# Altium footprint library Basal.PcbLib: 248 footprints (part 16 of 16)
Each footprint in its own frame and in the unit in brackets; x right, y up, seen from the top. Pads: shape width x height; smd on the part's side, far side on the other; paste and mask are expansions set on the pad; w line width, h text height; cw(c..) or ccw(c..) is an arc to the next point about the centre after c.
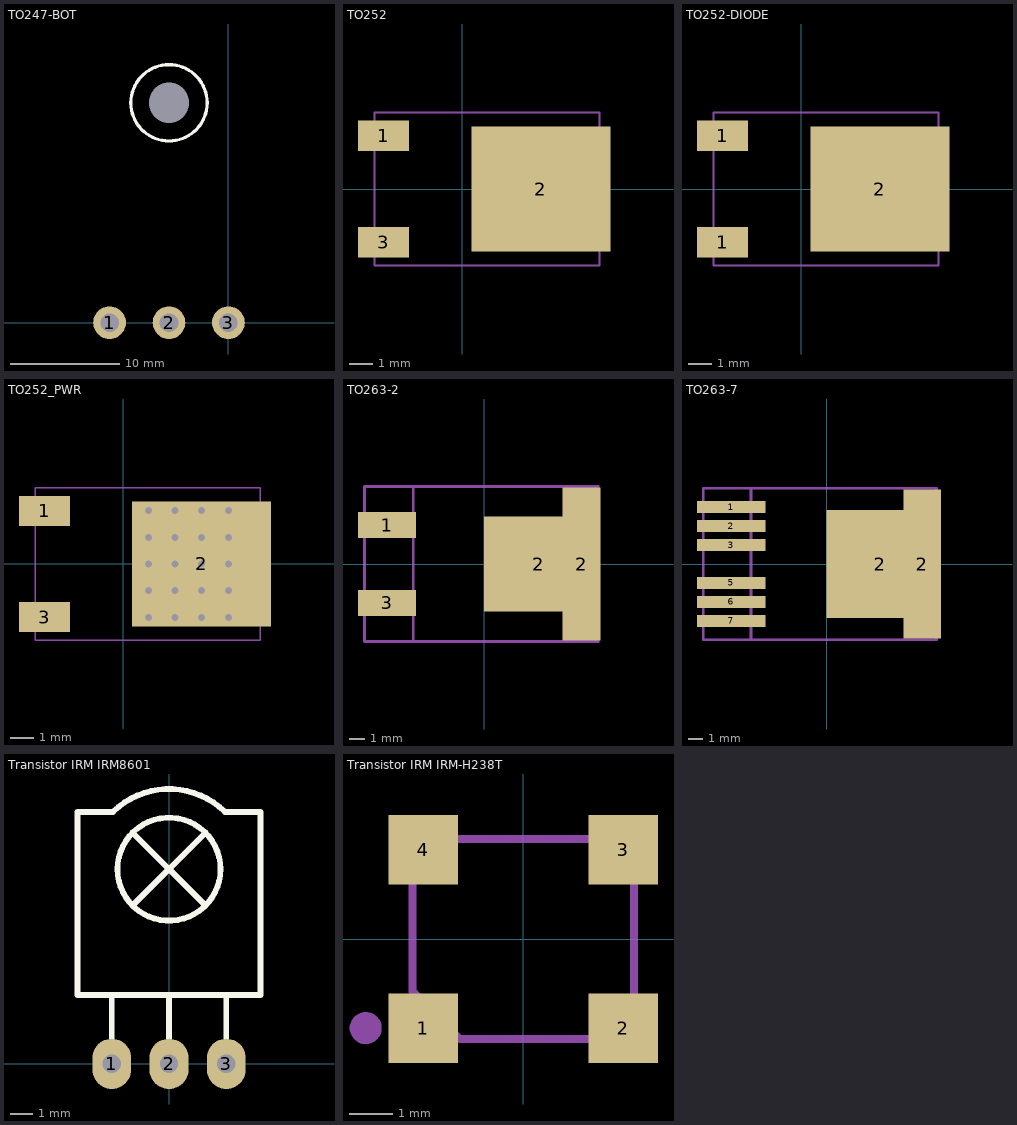
[diagram p15: the footprints below, top view; thin cyan lines are the x and y axes]

## TO247-BOT [mm]
pads (4):
  round 0 hole 3.7: 0(-5.45,20.15)
  round 3 hole 1.7: 1(-10.9,0) 2(-5.45,0) 3(0,0)
Top Overlay:
  circle w0.3: c-5.45,20.15 r3.5
Bottom Overlay:
  lines w0.254: -11.95,5.3 -11.95,1.3 -9.85,1.3 -9.85,5.3 ; -6.95,5.3 -6.95,1.3 -3.95,1.3 -3.95,5.3 ; -1.05,5.3 -1.05,1.3 1.05,1.3 1.05,5.3 ; -13.4,5.3 -13.4,26 2.5,26 2.5,5.3 -13.4,5.3
3D body "TO-247AC_bent_leads.STEP": height 7.05, standoff -5.75, extent -13.4,-0.25 2.5,25.65

## TO252 [mm] "MOS管TO-252封装"
height 2.39
pads (3):
  rect 2.2x1.3 smd: 1(-3.389,2.29) 3(-3.389,-2.29)
  rect 6x5.4 smd paste-3.048: 2(3.39,0)
Top Paste:
  region: 5.461,2.565 5.461,-2.565 6.274,-2.565 6.274,2.565
  region: 4.547,2.261 4.547,1.372 5.131,1.372 5.131,2.261
  region: 4.547,-1.321 4.547,-2.21 5.131,-2.21 5.131,-1.321
  region: 4.547,1.067 4.547,0.178 5.131,0.178 5.131,1.067
  region: 4.547,-0.127 4.547,-1.016 5.131,-1.016 5.131,-0.127
  region: 3.708,-0.127 3.708,-1.016 4.293,-1.016 4.293,-0.127
  region: 3.708,1.067 3.708,0.178 4.293,0.178 4.293,1.067
  region: 3.708,-1.321 3.708,-2.21 4.293,-2.21 4.293,-1.321
  region: 3.708,2.261 3.708,1.372 4.293,1.372 4.293,2.261
  region: 2.87,-0.127 2.87,-1.016 3.454,-1.016 3.454,-0.127
  region: 2.87,1.067 2.87,0.178 3.454,0.178 3.454,1.067
  region: 2.87,-1.321 2.87,-2.21 3.454,-2.21 3.454,-1.321
  region: 2.87,2.261 2.87,1.372 3.454,1.372 3.454,2.261
  region: 2.032,-0.127 2.032,-1.016 2.616,-1.016 2.616,-0.127
  region: 2.032,1.067 2.032,0.178 2.616,0.178 2.616,1.067
  region: 2.032,-1.321 2.032,-2.21 2.616,-2.21 2.616,-1.321
  region: 2.032,2.261 2.032,1.372 2.616,1.372 2.616,2.261
  region: 1.194,-0.127 1.194,-1.016 1.778,-1.016 1.778,-0.127
  region: 1.194,1.067 1.194,0.178 1.778,0.178 1.778,1.067
Mechanical 15:
  lines w0.076: -3.785,-3.29 5.915,-3.29 5.915,3.29 -3.785,3.29 -3.785,-3.29
3D body "TO-252_2.STEP": height 2.3, standoff 0, extent -3.785,-3.29 5.915,3.29

## TO252-DIODE [mm] "MOS管TO-252封装"
height 2.39
pads (3):
  rect 2.2x1.3 smd: 1(-3.389,-2.29) 1(-3.389,2.29)
  rect 6x5.4 smd paste-3.048: 2(3.39,0)
Top Paste:
  region: 4.724,2.261 4.724,1.372 5.309,1.372 5.309,2.261
  region: 4.724,-1.321 4.724,-2.21 5.309,-2.21 5.309,-1.321
  region: 4.724,1.067 4.724,0.178 5.309,0.178 5.309,1.067
  region: 4.724,-0.127 4.724,-1.016 5.309,-1.016 5.309,-0.127
  region: 3.886,-0.127 3.886,-1.016 4.47,-1.016 4.47,-0.127
  region: 3.886,1.067 3.886,0.178 4.47,0.178 4.47,1.067
  region: 3.886,-1.321 3.886,-2.21 4.47,-2.21 4.47,-1.321
  region: 3.886,2.261 3.886,1.372 4.47,1.372 4.47,2.261
  region: 3.048,-0.127 3.048,-1.016 3.632,-1.016 3.632,-0.127
  region: 3.048,1.067 3.048,0.178 3.632,0.178 3.632,1.067
  region: 3.048,-1.321 3.048,-2.21 3.632,-2.21 3.632,-1.321
  region: 3.048,2.261 3.048,1.372 3.632,1.372 3.632,2.261
  region: 2.21,-0.127 2.21,-1.016 2.794,-1.016 2.794,-0.127
  region: 2.21,1.067 2.21,0.178 2.794,0.178 2.794,1.067
  region: 2.21,-1.321 2.21,-2.21 2.794,-2.21 2.794,-1.321
  region: 2.21,2.261 2.21,1.372 2.794,1.372 2.794,2.261
  region: 1.372,-0.127 1.372,-1.016 1.956,-1.016 1.956,-0.127
  region: 1.372,1.067 1.372,0.178 1.956,0.178 1.956,1.067
  region: 5.461,2.565 5.461,-2.565 6.274,-2.565 6.274,2.565
Mechanical 15:
  lines w0.076: -3.785,-3.29 -3.785,3.29 5.915,3.29 5.915,-3.29 -3.785,-3.29
3D body "TO-252_2.STEP": height 2.3, standoff 0, extent -3.785,-3.29 5.915,3.29

## TO252_PWR [mm] "MOS管TO-252封装,带散热过孔"
height 2.39
pads (3):
  rect 2.2x1.3 smd: 1(-3.389,2.29) 3(-3.389,-2.29)
  rect 6x5.4 smd paste-4: 2(3.39,0)
via 4.54,-2.3 diameter 0.6 hole 0.3
via 3.39,-2.3 diameter 0.6 hole 0.3
via 2.24,-2.3 diameter 0.6 hole 0.3
via 4.54,-1.15 diameter 0.6 hole 0.3
via 3.39,-1.15 diameter 0.6 hole 0.3
via 2.24,-1.15 diameter 0.6 hole 0.3
via 4.54,0 diameter 0.6 hole 0.3
via 3.39,0 diameter 0.6 hole 0.3
via 2.24,0 diameter 0.6 hole 0.3
via 4.54,1.15 diameter 0.6 hole 0.3
via 3.39,1.15 diameter 0.6 hole 0.3
via 4.54,2.3 diameter 0.6 hole 0.3
via 3.39,2.3 diameter 0.6 hole 0.3
via 1.089,-2.3 diameter 0.6 hole 0.3
via 1.089,-1.15 diameter 0.6 hole 0.3
via 2.24,1.15 diameter 0.6 hole 0.3
via 1.089,0 diameter 0.6 hole 0.3
via 1.089,1.15 diameter 0.6 hole 0.3
via 2.24,2.3 diameter 0.6 hole 0.3
via 1.089,2.3 diameter 0.6 hole 0.3
Top Paste:
  rectangle: 4.774,-2.071 5.225,-1.371
  rectangle: 4.774,-0.921 5.225,-0.221
  rectangle: 4.774,0.229 5.225,0.929
  region: 5.479,2.565 5.479,-2.565 6.292,-2.565 6.292,2.565
  rectangle: 4.774,1.379 5.225,2.079
  rectangle: 3.624,0.229 4.324,0.929
  rectangle: 3.624,1.379 4.324,2.079
  rectangle: 3.624,-0.921 4.324,-0.221
  rectangle: 3.624,-2.071 4.324,-1.371
  rectangle: 2.474,0.229 3.174,0.929
  rectangle: 2.474,1.379 3.174,2.079
  rectangle: 2.474,-0.921 3.174,-0.221
  rectangle: 2.474,-2.071 3.174,-1.371
  rectangle: 1.324,-2.071 2.024,-1.371
  rectangle: 1.324,-0.921 2.024,-0.221
  rectangle: 1.324,1.379 2.024,2.079
  rectangle: 1.324,0.229 2.024,0.929
Mechanical 15:
  lines w0.076: -3.785,-3.29 5.915,-3.29 5.915,3.29 -3.785,3.29 -3.785,-3.29
3D body "TO-252_2.STEP": height 2.3, standoff 0, extent -3.785,-3.29 5.915,3.29

## TO263-2 [mm] "MOS管TO-263封装"
pads (4):
  rect 3.8x1.7 smd: 1(-6.37,2.54) 3(-6.37,-2.54)
  rect 7.2x6.2 smd paste-5: 2(3.563,0)
  rect 2.5x10 smd paste-5: 2(6.37,0)
Top Paste:
  region: 6.083,-4.039 6.083,-0.279 5.182,-0.279 5.182,-4.039
  region: 3.696,2.769 3.696,0.279 4.889,0.279 4.889,2.769
  region: 5.182,4.039 5.182,0.279 6.083,0.279 6.083,4.039
  region: 6.363,4.547 6.363,0.279 7.556,0.279 7.556,4.547
  region: 7.556,-4.547 7.556,-0.279 6.363,-0.279 6.363,-4.547
  region: 4.889,-2.769 4.889,-0.279 3.696,-0.279 3.696,-2.769
  region: 2.73,1.676 2.73,0.279 3.416,0.279 3.416,1.676
  region: 3.416,-1.676 3.416,-0.279 2.73,-0.279 2.73,-1.676
Mechanical 15:
  lines w0.178: -4.649,-5.069 -4.649,5.069 ; -7.849,-5.069 -7.849,5.069 7.451,5.069 7.451,-5.069 -7.849,-5.069
3D body "TO-263-2.STEP": height 4.88, standoff -0.13, extent -7.713,-5.08 7.551,5.08

## TO263-7 [mm]
pads (8):
  rect 4.6x0.8 smd: 1(-6.396,3.81) 2(-6.396,2.54) 3(-6.396,1.27) 5(-6.396,-1.27) 6(-6.396,-2.54) 7(-6.396,-3.81)
  rect 7.2x7.2 smd paste-5: 2(3.589,0)
  rect 2.5x10 smd paste-5: 2(6.396,0)
Top Paste:
  region: 6.109,-4.039 6.109,-0.279 5.208,-0.279 5.208,-4.039
  region: 3.722,2.769 3.722,0.279 4.916,0.279 4.916,2.769
  region: 5.208,4.039 5.208,0.279 6.109,0.279 6.109,4.039
  region: 6.389,4.547 6.389,0.279 7.583,0.279 7.583,4.547
  region: 7.583,-4.547 7.583,-0.279 6.389,-0.279 6.389,-4.547
  region: 4.916,-2.769 4.916,-0.279 3.722,-0.279 3.722,-2.769
  region: 2.757,1.676 2.757,0.279 3.442,0.279 3.442,1.676
  region: 3.442,-1.676 3.442,-0.279 2.757,-0.279 2.757,-1.676
Mechanical 15:
  lines w0.178: -5.082,-5.069 -5.082,5.069 ; -8.282,-5.069 7.341,-5.069 7.341,5.069 -8.282,5.069 -8.282,-5.069
3D body "D2PAK-7.STEP": height 4.5, standoff 0, extent -8.325,-5.2 7.349,5.2

## Transistor IRM IRM8601 [mm] "红外遥控接收头"
pads (3):
  oval 1.7x2.2 hole 0.8: 1(-2.5,0) 2(0,0) 3(2.5,0)
Top Overlay:
  circle w0.254: c0,8.5 r2.25
  lines w0.254: -2.5,1.1 -2.5,3 ; -1.6,6.9 1.6,10.1 ; -1.6,10.1 1.6,6.9 ; 0,1.1 0,3 ; 2.5,1.1 2.5,3 ; -4.001,11.001 -4,3 4,3 4,11 2.447,11.002 ccw(c0,8.5) -2.447,11.002 -4.001,11.001
3D body "IR reciver.STEP": height 5.22, standoff -2.57, extent -3.036,-0.305 2.964,12.801

## Transistor IRM IRM-H238T [mm] "红外遥控接收头"
pads (4):
  rect 1.6x1.6 smd: 1(-2.3,-2.05) 2(2.3,-2.05) 3(2.3,2.05) 4(-2.3,2.05)
Mechanical 15:
  circle w0.381: c-3.625,-2.05 r0.178
  lines w0.178: -2.55,-1.209 -1.459,-2.3 2.55,-2.3 2.55,2.3 -2.55,2.3 -2.55,-1.209
3D body: height 1.46, standoff 0.1, extent -2.55,-2.3 2.55,2.3
3D body: height 1.46, standoff 0.11, extent -2.1,-1.025 -0.1,1.025